# Altium footprint library Connectors THD.PcbLib: 631 footprints (part 17 of 46) (continued)
## HARTING_09 04 132 6921 [mm] "Eurocard DIN 41612, Type D, 32 Position, Rows a+c, Performance level 2, Male, Lead 3.0 mm, Pitch 5.08 mm" (continued)
  text "26" at -8.57,-61.635 h1.2
  text "32" at -8.57,-76.875 h1.2
  text "10" at -8.57,-20.995 h1.2
  text "20" at -8.57,-46.395 h1.2
  text "28" at -8.57,-66.715 h1.2
  text "30" at -8.57,-71.795 h1.2
  text "c" at -4.445,1.905 h1.2
  text "a" at 0.635,1.905 h1.2
3D body: height 9.4, standoff -3, extent -5.38,-83.83 12.64,10.17

## HARTING_09 04 232 6831 [mm] "DIN 41612, Type D, Thru-Hole; Rows a+c, 32 Position, Straight Female Backplane Connector"
height 11.6
pads (34):
  round 1.7 hole 1: a2(0,-2.54) a4(0,-7.62) a6(0,-12.7) a8(0,-17.78) a10(0,-22.86) a12(0,-27.94) a14(0,-33.02) a16(0,-38.1) a18(0,-43.18) a20(0,-48.26) a22(0,-53.34) a24(0,-58.42) a26(0,-63.5) a28(0,-68.58) a30(0,-73.66) a32(0,-78.74) c2(5.08,-2.54) c4(5.08,-7.62) c6(5.08,-12.7) c8(5.08,-17.78) c10(5.08,-22.86) c12(5.08,-27.94) c14(5.08,-33.02) c16(5.08,-38.1) c18(5.08,-43.18) c20(5.08,-48.26) c22(5.08,-53.34) c24(5.08,-58.42) c26(5.08,-63.5) c28(5.08,-68.58) c30(5.08,-73.66) c32(5.08,-78.74)
  round 3.5 / inner round 3.5 / far side round 5.1 hole 2.8: MTG1(2.24,5.63) MTG2(2.24,-84.37)
Top Overlay:
  lines w0.2: -2.71,-84.37 -0.735,-84.37 ; -2.71,-77.87 -1.71,-77.87 ; -2.71,-0.87 -1.71,-0.87 ; -2.71,5.63 -0.735,5.63 ; -1.06,-79.95 -1.06,-81.22 ; -1.06,-1.2 -1.06,2.48 ; -0.735,-86.82 -0.735,-84.37 ; -0.735,8.08 -0.735,5.63 ; 1,-86.82 -2.71,-86.82 -2.71,8.08 1,8.08 ; 3.556,-86.82 7.79,-86.82 7.79,8.08 3.556,8.08 ; 5.215,-86.82 5.215,-84.37 ; 5.215,8.08 5.215,5.63 ; 6.14,-79.75 6.14,-80.19 ; 6.14,-1.1 6.14,1.45 ; 6.79,-77.87 7.79,-77.87 ; 6.79,-0.87 7.79,-0.87 ; 7.79,-84.37 5.215,-84.37 ; 7.79,5.63 5.215,5.63 ; -1.71,-81.87 3.69,-81.87 ; -1.71,-81.87 -1.71,3.13 ; -1.71,-81.87 -1.06,-81.22 ; -1.71,3.13 3.69,3.13 ; -1.71,3.13 -1.06,2.48 ; -1.06,-81.22 3.04,-81.22 ; -1.06,2.48 3.04,2.48 ; -0.735,-84.37 0.708,-81.87 3.772,-81.87 5.215,-84.37 ; -0.735,5.63 0.708,3.13 3.772,3.13 5.215,5.63 ; 3.04,-81.22 3.04,-80.19 ; 3.04,-81.22 3.69,-81.87 ; 3.04,-80.19 6.14,-80.19 ; 3.04,-80.19 3.69,-80.84 ; 3.04,1.45 3.04,2.48 ; 3.04,1.45 3.69,2.1 ; 3.04,1.45 6.14,1.45 ; 3.04,2.48 3.69,3.13 ; 3.69,-81.87 3.69,-80.84 ; 3.69,-80.84 6.79,-80.84 ; 3.69,2.1 3.69,3.13 ; 3.69,2.1 6.79,2.1 ; 6.14,-80.19 6.79,-80.84 ; 6.14,1.45 6.79,2.1 ; 6.79,-80.84 6.79,2.1
  text "a" at -1.951,3.96 h1.2
  text "c" at 5.305,2.935 h1.2
  text "10" at -5.475,-23.46 h1.2
  text "32" at -5.675,-79.365 h1.2
  text "5" at -4.55,-10.835 h1.2
  text "30" at -5.675,-74.285 h1.2
  text "25" at -5.675,-61.585 h1.2
  text "20" at -5.675,-48.885 h1.2
  text "15" at -5.475,-36.135 h1.2
  text "1" at -4.075,-0.675 h1.2
Mechanical 8:
  lines w0.1: -1,-78.74 0,-78.74 ; -1,-73.66 0,-73.66 ; -1,-68.58 0,-68.58 ; -1,-63.5 0,-63.5 ; -1,-58.42 0,-58.42 ; -1,-53.34 0,-53.34 ; -1,-48.26 0,-48.26 ; -1,-43.18 0,-43.18 ; -1,-38.1 0,-38.1 ; -1,-33.02 0,-33.02 ; -1,-27.94 0,-27.94 ; -1,-22.86 0,-22.86 ; -1,-17.78 0,-17.78 ; -1,-12.7 0,-12.7 ; -1,-7.62 0,-7.62 ; -1,-2.54 0,-2.54 ; 0,-79.74 0,-78.74 ; 0,-77.74 0,-78.74 ; 0,-74.66 0,-73.66 ; 0,-72.66 0,-73.66 ; 0,-69.58 0,-68.58 ; 0,-67.58 0,-68.58 ; 0,-64.5 0,-63.5 ; 0,-62.5 0,-63.5 ; 0,-59.42 0,-58.42 ; 0,-57.42 0,-58.42 ; 0,-54.34 0,-53.34 ; 0,-52.34 0,-53.34 ; 0,-49.26 0,-48.26 ; 0,-47.26 0,-48.26 ; 0,-44.18 0,-43.18 ; 0,-42.18 0,-43.18 ; 0,-39.1 0,-38.1 ; 0,-37.1 0,-38.1 ; 0,-34.02 0,-33.02 ; 0,-32.02 0,-33.02 ; 0,-28.94 0,-27.94 ; 0,-26.94 0,-27.94 ; 0,-23.86 0,-22.86 ; 0,-21.86 0,-22.86 ; 0,-18.78 0,-17.78 ; 0,-16.78 0,-17.78 ; 0,-13.7 0,-12.7 ; 0,-11.7 0,-12.7 ; 0,-8.62 0,-7.62 ; 0,-6.62 0,-7.62 ; 0,-3.54 0,-2.54 ; 0,-1.54 0,-2.54 ; 1,-78.74 0,-78.74 ; 1,-73.66 0,-73.66 ; 1,-68.58 0,-68.58 ; 1,-63.5 0,-63.5 ; 1,-58.42 0,-58.42 ; 1,-53.34 0,-53.34 ; 1,-48.26 0,-48.26 ; 1,-43.18 0,-43.18 ; 1,-38.1 0,-38.1 ; 1,-33.02 0,-33.02 ; 1,-27.94 0,-27.94 ; 1,-22.86 0,-22.86 ; 1,-17.78 0,-17.78 ; 1,-12.7 0,-12.7 ; 1,-7.62 0,-7.62 ; 1,-2.54 0,-2.54 ; 1.24,-84.37 2.24,-84.37 ; 1.24,5.63 2.24,5.63 ; 1.54,-39.37 2.54,-39.37 ; 2.24,-85.37 2.24,-84.37 ; 2.24,-83.37 2.24,-84.37 ; 2.24,4.63 2.24,5.63 ; 2.24,6.63 2.24,5.63 ; 2.54,-40.37 2.54,-39.37 ; 2.54,-38.37 2.54,-39.37 ; 3.24,-84.37 2.24,-84.37 ; 3.24,5.63 2.24,5.63 ; 3.54,-39.37 2.54,-39.37 ; 4.08,-78.74 5.08,-78.74 ; 4.08,-73.66 5.08,-73.66 ; 4.08,-68.58 5.08,-68.58 ; 4.08,-63.5 5.08,-63.5 ; 4.08,-58.42 5.08,-58.42 ; 4.08,-53.34 5.08,-53.34 ; 4.08,-48.26 5.08,-48.26 ; 4.08,-43.18 5.08,-43.18 ; 4.08,-38.1 5.08,-38.1 ; 4.08,-33.02 5.08,-33.02 ; 4.08,-27.94 5.08,-27.94 ; 4.08,-22.86 5.08,-22.86 ; 4.08,-17.78 5.08,-17.78 ; 4.08,-12.7 5.08,-12.7 ; 4.08,-7.62 5.08,-7.62 ; 4.08,-2.54 5.08,-2.54 ; 5.08,-79.74 5.08,-78.74 ; 5.08,-77.74 5.08,-78.74 ; 5.08,-74.66 5.08,-73.66 ; 5.08,-72.66 5.08,-73.66 ; 5.08,-69.58 5.08,-68.58 ; 5.08,-67.58 5.08,-68.58 ; 5.08,-64.5 5.08,-63.5 ; 5.08,-62.5 5.08,-63.5 ; 5.08,-59.42 5.08,-58.42 ; 5.08,-57.42 5.08,-58.42 ; 5.08,-54.34 5.08,-53.34 ; 5.08,-52.34 5.08,-53.34 ; 5.08,-49.26 5.08,-48.26 ; 5.08,-47.26 5.08,-48.26 ; 5.08,-44.18 5.08,-43.18 ; 5.08,-42.18 5.08,-43.18 ; 5.08,-39.1 5.08,-38.1 ; 5.08,-37.1 5.08,-38.1 ; 5.08,-34.02 5.08,-33.02 ; 5.08,-32.02 5.08,-33.02 ; 5.08,-28.94 5.08,-27.94 ; 5.08,-26.94 5.08,-27.94 ; 5.08,-23.86 5.08,-22.86 ; 5.08,-21.86 5.08,-22.86 ; 5.08,-18.78 5.08,-17.78 ; 5.08,-16.78 5.08,-17.78 ; 5.08,-13.7 5.08,-12.7 ; 5.08,-11.7 5.08,-12.7 ; 5.08,-8.62 5.08,-7.62 ; 5.08,-6.62 5.08,-7.62 ; 5.08,-3.54 5.08,-2.54 ; 5.08,-1.54 5.08,-2.54 ; 6.08,-78.74 5.08,-78.74 ; 6.08,-73.66 5.08,-73.66 ; 6.08,-68.58 5.08,-68.58 ; 6.08,-63.5 5.08,-63.5 ; 6.08,-58.42 5.08,-58.42 ; 6.08,-53.34 5.08,-53.34 ; 6.08,-48.26 5.08,-48.26 ; 6.08,-43.18 5.08,-43.18 ; 6.08,-38.1 5.08,-38.1 ; 6.08,-33.02 5.08,-33.02 ; 6.08,-27.94 5.08,-27.94 ; 6.08,-22.86 5.08,-22.86 ; 6.08,-17.78 5.08,-17.78 ; 6.08,-12.7 5.08,-12.7 ; 6.08,-7.62 5.08,-7.62 ; 6.08,-2.54 5.08,-2.54
Mechanical 14:
  circle w0.1: c2.24,5.63 r1.425
  circle w0.1: c2.24,-84.37 r1.425
  lines w0.1: -2.71,-84.37 -0.735,-84.37 ; -2.71,-77.87 -1.71,-77.87 ; -2.71,-0.87 -1.71,-0.87 ; -0.735,-86.82 -0.735,-84.37 ; -0.735,8.08 -0.735,5.63 0.708,3.13 3.772,3.13 5.215,5.63 ; -0.3,2.925 1.675,2.925 ; 5.215,-86.82 5.215,-84.37 ; 5.215,8.08 5.215,5.63 ; 6.79,-77.87 7.79,-77.87 ; 6.79,-0.87 7.79,-0.87 ; 7.79,-84.37 5.215,-84.37 ; 7.79,5.63 5.215,5.63 ; -1.71,-81.87 3.69,-81.87 ; -1.71,-81.87 -1.71,3.13 ; -1.71,-81.87 -1.06,-81.22 ; -1.71,3.13 3.69,3.13 ; -1.71,3.13 -1.06,2.48 ; -1.06,-81.22 3.04,-81.22 ; -1.06,-81.22 -1.06,2.48 ; -1.06,2.48 3.04,2.48 ; -0.735,-84.37 0.708,-81.87 3.772,-81.87 5.215,-84.37 ; 3.04,-81.22 3.04,-80.19 ; 3.04,-81.22 3.69,-81.87 ; 3.04,-80.19 6.14,-80.19 ; 3.04,-80.19 3.69,-80.84 ; 3.04,1.45 3.04,2.48 ; 3.04,1.45 3.69,2.1 ; 3.04,1.45 6.14,1.45 ; 3.04,2.48 3.69,3.13 ; 3.69,-81.87 3.69,-80.84 ; 3.69,-80.84 6.79,-80.84 ; 3.69,2.1 3.69,3.13 ; 3.69,2.1 6.79,2.1 ; 6.14,-80.19 6.14,1.45 ; 6.14,-80.19 6.79,-80.84 ; 6.14,1.45 6.79,2.1 ; 6.79,-80.84 6.79,2.1 ; -2.71,-86.82 7.79,-86.82 7.79,8.08 -2.71,8.08 -2.71,-86.82
  text "a" at -1.951,3.96 h1.2
  text "c" at 5.305,2.935 h1.2
  text "10" at -5.475,-23.46 h1.2
  text "32" at -5.675,-79.365 h1.2
  text "5" at -4.55,-10.835 h1.2
  text "30" at -5.675,-74.285 h1.2
  text "25" at -5.675,-61.585 h1.2
  text "20" at -5.675,-48.885 h1.2
  text "15" at -5.475,-36.135 h1.2
  text "1" at -4.075,-0.675 h1.2
3D body: height 11.6, standoff -4.5, extent -2.71,-86.82 7.79,8.08

## HARTING_09 06 115 2911 [mm] "DIN 41612, Type H, 15 Poles, Rows z+d, Performance level 1, Right Angle Male Connector, Lead 3.0 mm, Pitch 5.08mm"
height 11
pads (17):
  round 2.3 hole 1.6: d6(-5.08,-5.08) d10(-5.08,-15.24) d14(-5.08,-25.4) d18(-5.08,-35.56) d22(-5.08,-45.72) d26(-5.08,-55.88) d30(-5.08,-66.04) z4(0,0) z8(0,-10.16) z12(0,-20.32) z16(0,-30.48) z20(0,-40.64) z24(0,-50.8) z28(0,-60.96) z32(0,-71.12)
  round 3.5 / inner round 3.5 / far side round 5.1 hole 2.8: MTG1(5.08,12.7) MTG2(5.08,-76.2)
Top Overlay:
  lines w0.2: -6.02,-71.55 -1.696,-71.55 ; -6.02,-67.516 -6.02,-74.3 2.18,-74.3 2.18,-78.725 4.14,-78.725 ; -6.02,-64.564 -6.02,-57.356 ; -6.02,-54.404 -6.02,-47.196 ; -6.02,-44.244 -6.02,-37.036 ; -6.02,-34.084 -6.02,-26.876 ; -6.02,-23.924 -6.02,-16.716 ; -6.02,-13.764 -6.02,-6.556 ; -6.02,-3.604 -6.02,10.8 2.18,10.8 2.18,15.225 4.14,15.225 ; -6.02,4.67 8.38,4.67 8.38,11.95 18.73,11.95 18.73,9.05 17.21,9.05 17.21,-72.55 18.73,-72.55 18.73,-75.45 8.38,-75.45 8.38,-71.55 1.696,-71.55 ; 5.765,-78.725 10.23,-78.725 10.23,-75.45 ; 5.765,15.225 10.23,15.225 10.23,11.95
  text "z4" at -8.8,-0.75 h1.2
  text "d6" at -8.8,-5.83 h1.2
  text "d10" at -10.07,-15.99 h1.2
  text "z8" at -8.8,-10.91 h1.2
  text "d14" at -10.07,-26.15 h1.2
  text "z12" at -10.07,-21.07 h1.2
  text "d18" at -10.07,-36.31 h1.2
  text "z16" at -10.07,-31.23 h1.2
  text "d22" at -10.07,-46.47 h1.2
  text "z20" at -10.07,-41.39 h1.2
  text "d26" at -10.07,-56.63 h1.2
  text "z24" at -10.07,-51.55 h1.2
  text "d30" at -10.07,-66.79 h1.2
  text "z28" at -10.07,-61.71 h1.2
  text "z32" at -10.07,-71.87 h1.2
Mechanical 8:
  lines w0.2: 4.064,-31.75 5.08,-31.75 5.08,-32.75 ; 7.84,-78.725 7.84,15.225
  text "PCB" at 6.985,-33.655 h1.2
Mechanical 14:
  lines w0.1: -6.02,-71.55 -1.696,-71.55 ; -6.02,-67.516 -6.02,-74.3 2.18,-74.3 2.18,-78.725 10.23,-78.725 10.23,-75.45 ; -6.02,-64.564 -6.02,-57.356 ; -6.02,-54.404 -6.02,-47.196 ; -6.02,-44.244 -6.02,-37.036 ; -6.02,-34.084 -6.02,-26.876 ; -6.02,-23.924 -6.02,-16.716 ; -6.02,-13.764 -6.02,-6.556 ; -6.02,-3.604 -6.02,10.8 2.18,10.8 2.18,15.225 10.23,15.225 10.23,11.95 ; -6.02,4.67 8.38,4.67 8.38,11.95 18.73,11.95 18.73,9.05 17.21,9.05 17.21,-72.55 18.73,-72.55 18.73,-75.45 8.38,-75.45 8.38,-71.55 1.696,-71.55
  text "z4" at -8.8,-0.75 h1.2
  text "d6" at -8.8,-5.83 h1.2
  text "d10" at -10.07,-15.99 h1.2
  text "z8" at -8.8,-10.91 h1.2
  text "d14" at -10.07,-26.15 h1.2
  text "z12" at -10.07,-21.07 h1.2
  text "d18" at -10.07,-36.31 h1.2
  text "z16" at -10.07,-31.23 h1.2
  text "d22" at -10.07,-46.47 h1.2
  text "z20" at -10.07,-41.39 h1.2
  text "d26" at -10.07,-56.63 h1.2
  text "z24" at -10.07,-51.55 h1.2
  text "d30" at -10.07,-66.79 h1.2
  text "z28" at -10.07,-61.71 h1.2
  text "z32" at -10.07,-71.87 h1.2
3D body: height 11.2, standoff -3.5, extent -6.02,-78.725 18.73,15.225

## HARTING_09 06 131 6924 [mm] "DIN 41612, Type MH, 24+ 7 Contacts, Rows z+b+d, Performance level 2, Right Angled Male Connector"
height 11.22
pads (33):
  round 1.7 hole 1: b2(2.54,0) b4(2.54,-5.08) b6(2.54,-10.16) b8(2.54,-15.24) b10(2.54,-20.32) b12(2.54,-25.4) b14(2.54,-30.48) b16(2.54,-35.56) d2(0,0) d4(0,-5.08) d6(0,-10.16) d8(0,-15.24) d10(0,-20.32) d12(0,-25.4) d14(0,-30.48) d16(0,-35.56) z2(5.08,0) z4(5.08,-5.08) z6(5.08,-10.16) z8(5.08,-15.24) z10(5.08,-20.32) z12(5.08,-25.4) z14(5.08,-30.48) z16(5.08,-35.56)
  round 2.3 hole 1.6: d22(-2.54,-50.8) d26(-2.54,-60.96) d30(-2.54,-71.12) z20(2.54,-45.72) z24(2.54,-55.88) z28(2.54,-66.04) z32(2.54,-76.2)
  round 3.5 / inner round 3.5 / far side round 5.1 hole 2.8: MTG1(7.62,7.62) MTG2(7.62,-81.28)
Top Overlay:
  lines w0.2: -3.43,-76.63 1.051,-76.63 ; -2.63,-72.667 -2.63,-75.83 -3.43,-75.83 -3.43,-79.36 4.67,-79.36 4.67,-83.805 6.325,-83.805 ; -2.63,-69.573 -2.63,-62.507 ; -2.63,-59.413 -2.63,-52.347 ; -2.63,-49.253 -2.63,-41.345 -0.83,-41.345 -0.83,-38.1 -0.68,-38.1 -0.68,-36.668 ; -0.68,-34.452 -0.68,-31.588 ; -0.68,-29.372 -0.68,-26.508 ; -0.68,-24.292 -0.68,-21.428 ; -0.68,-19.212 -0.68,-16.348 ; -0.68,-14.132 -0.68,-11.268 ; -0.68,-9.052 -0.68,-6.188 ; -0.68,-3.972 -0.68,-1.108 ; -0.68,1.108 -0.68,4.79 10.77,4.79 ; -0.68,3.62 10.77,3.62 10.77,6.87 21.32,6.87 21.32,3.97 19.82,3.97 19.82,-77.63 21.32,-77.63 21.32,-80.53 10.77,-80.53 ; 4.029,-76.63 10.77,-76.63 ; 4.67,4.79 4.67,10.145 6.325,10.145 ; 9.025,-83.805 12.77,-83.805 12.77,-80.53 ; 9.025,10.145 12.77,10.145 12.77,6.87 ; 10.77,-80.53 10.77,-76.63 ; 10.77,-80.53 10.77,-76.63
  text "16" at -3.74,-36.165 h1.2
  text "14" at -3.74,-31.085 h1.2
  text "12" at -3.74,-26.005 h1.2
  text "10" at -3.74,-20.925 h1.2
  text "8" at -2.79,-15.845 h1.2
  text "6" at -2.79,-10.765 h1.2
  text "d" at -0.318,1.905 h1.2
  text "z" at 4.608,1.905 h1.2
  text "4" at -2.79,-5.685 h1.2
  text "2" at -2.765,-0.543 h1.2
  text "b" at 2.223,1.905 h1.2
  text "z32" at -7.53,-76.95 h1.2
  text "z28" at -7.53,-66.79 h1.2
  text "d30" at -7.53,-71.87 h1.2
  text "z24" at -7.53,-56.63 h1.2
  text "d26" at -7.53,-61.71 h1.2
  text "z20" at -7.53,-46.47 h1.2
  text "d22" at -7.53,-51.55 h1.2
Mechanical 8:
  lines w0.1: -3.04,-71.12 -2.54,-71.12 ; -3.04,-60.96 -2.54,-60.96 ; -3.04,-50.8 -2.54,-50.8 ; -2.54,-71.62 -2.54,-71.12 ; -2.54,-70.62 -2.54,-71.12 ; -2.54,-61.46 -2.54,-60.96 ; -2.54,-60.46 -2.54,-60.96 ; -2.54,-51.3 -2.54,-50.8 ; -2.54,-50.3 -2.54,-50.8 ; -2.04,-71.12 -2.54,-71.12 ; -2.04,-60.96 -2.54,-60.96 ; -2.04,-50.8 -2.54,-50.8 ; -0.5,-35.56 0,-35.56 ; -0.5,-30.48 0,-30.48 ; -0.5,-25.4 0,-25.4 ; -0.5,-20.32 0,-20.32 ; -0.5,-15.24 0,-15.24 ; -0.5,-10.16 0,-10.16 ; -0.5,-5.08 0,-5.08 ; 0,-36.06 0,-35.56 ; 0,-35.06 0,-35.56 ; 0,-30.98 0,-30.48 ; 0,-29.98 0,-30.48 ; 0,-25.9 0,-25.4 ; 0,-24.9 0,-25.4 ; 0,-20.82 0,-20.32 ; 0,-19.82 0,-20.32 ; 0,-15.74 0,-15.24 ; 0,-14.74 0,-15.24 ; 0,-10.66 0,-10.16 ; 0,-9.66 0,-10.16 ; 0,-5.58 0,-5.08 ; 0,-4.58 0,-5.08 ; 0.5,-35.56 0,-35.56 ; 0.5,-30.48 0,-30.48 ; 0.5,-25.4 0,-25.4 ; 0.5,-20.32 0,-20.32 ; 0.5,-15.24 0,-15.24 ; 0.5,-10.16 0,-10.16 ; 0.5,-5.08 0,-5.08 ; 2.04,-76.2 2.54,-76.2 ; 2.04,-66.04 2.54,-66.04 ; 2.04,-55.88 2.54,-55.88 ; 2.04,-45.72 2.54,-45.72 ; 2.04,-35.56 2.54,-35.56 ; 2.04,-30.48 2.54,-30.48 ; 2.04,-25.4 2.54,-25.4 ; 2.04,-20.32 2.54,-20.32 ; 2.04,-15.24 2.54,-15.24 ; 2.04,-10.16 2.54,-10.16 ; 2.04,-5.08 2.54,-5.08 ; 2.04,0 2.54,0 ; 2.54,-76.7 2.54,-76.2 ; 2.54,-75.7 2.54,-76.2 ; 2.54,-66.54 2.54,-66.04 ; 2.54,-65.54 2.54,-66.04 ; 2.54,-56.38 2.54,-55.88 ; 2.54,-55.38 2.54,-55.88 ; 2.54,-46.22 2.54,-45.72 ; 2.54,-45.22 2.54,-45.72 ; 2.54,-36.06 2.54,-35.56 ; 2.54,-35.06 2.54,-35.56 ; 2.54,-30.98 2.54,-30.48 ; 2.54,-29.98 2.54,-30.48 ; 2.54,-25.9 2.54,-25.4 ; 2.54,-24.9 2.54,-25.4 ; 2.54,-20.82 2.54,-20.32 ; 2.54,-19.82 2.54,-20.32 ; 2.54,-15.74 2.54,-15.24 ; 2.54,-14.74 2.54,-15.24 ; 2.54,-10.66 2.54,-10.16 ; 2.54,-9.66 2.54,-10.16 ; 2.54,-5.58 2.54,-5.08 ; 2.54,-4.58 2.54,-5.08 ; 2.54,-0.5 2.54,0 ; 2.54,0.5 2.54,0 ; 3.04,-76.2 2.54,-76.2 ; 3.04,-66.04 2.54,-66.04 ; 3.04,-55.88 2.54,-55.88 ; 3.04,-45.72 2.54,-45.72 ; 3.04,-35.56 2.54,-35.56 ; 3.04,-30.48 2.54,-30.48 ; 3.04,-25.4 2.54,-25.4 ; 3.04,-20.32 2.54,-20.32 ; 3.04,-15.24 2.54,-15.24 ; 3.04,-10.16 2.54,-10.16 ; 3.04,-5.08 2.54,-5.08 ; 3.04,0 2.54,0 ; 4.58,-35.56 5.08,-35.56 ; 4.58,-30.48 5.08,-30.48 ; 4.58,-25.4 5.08,-25.4 ; 4.58,-20.32 5.08,-20.32 ; 4.58,-15.24 5.08,-15.24 ; 4.58,-10.16 5.08,-10.16 ; 4.58,-5.08 5.08,-5.08 ; 4.58,0 5.08,0 ; 5.08,-36.06 5.08,-35.56 ; 5.08,-35.06 5.08,-35.56 ; 5.08,-30.98 5.08,-30.48 ; 5.08,-29.98 5.08,-30.48 ; 5.08,-25.9 5.08,-25.4 ; 5.08,-24.9 5.08,-25.4 ; 5.08,-20.82 5.08,-20.32 ; 5.08,-19.82 5.08,-20.32 ; 5.08,-15.74 5.08,-15.24 ; 5.08,-14.74 5.08,-15.24 ; 5.08,-10.66 5.08,-10.16 ; 5.08,-9.66 5.08,-10.16 ; 5.08,-5.58 5.08,-5.08 ; 5.08,-4.58 5.08,-5.08 ; 5.08,-0.5 5.08,0 ; 5.08,0.5 5.08,0 ; 5.58,-35.56 5.08,-35.56 ; 5.58,-30.48 5.08,-30.48 ; 5.58,-25.4 5.08,-25.4 ; 5.58,-20.32 5.08,-20.32 ; 5.58,-15.24 5.08,-15.24 ; 5.58,-10.16 5.08,-10.16 ; 5.58,-5.08 5.08,-5.08 ; 5.58,0 5.08,0 ; 7.12,-81.28 7.62,-81.28 ; 7.12,7.62 7.62,7.62 ; 7.62,-81.78 7.62,-81.28 ; 7.62,-80.78 7.62,-81.28 ; 7.62,7.12 7.62,7.62 ; 7.62,8.12 7.62,7.62 ; 8.12,-81.28 7.62,-81.28 ; 8.12,7.62 7.62,7.62 ; 10.38,-83.805 10.38,-36.83 10.38,10.145 ; 0,0 0,0.5 0,0 ; 0,0 -0.5,0 0,0 ; 0,0 0,-0.5 0,0 ; 0,0 0.5,0 0,0
  text "PCB Edge" at 9.525,-38.735 h1.2
Mechanical 14:
  circle w0.1: c7.62,-81.28 r1.29
  circle w0.1: c7.62,7.62 r1.29
  lines w0.1: -3.43,-76.63 10.77,-76.63 ; -0.68,3.62 10.77,3.62 10.77,6.87 21.32,6.87 21.32,3.97 19.82,3.97 19.82,-77.63 21.32,-77.63 21.32,-80.53 10.77,-80.53 ; 4.67,4.79 4.67,10.145 12.77,10.145 12.77,6.87 ; 10.77,4.79 -0.68,4.79 -0.68,-38.1 -0.83,-38.1 -0.83,-41.345 -2.63,-41.345 -2.63,-75.83 -3.43,-75.83 -3.43,-79.36 4.67,-79.36 4.67,-83.805 12.77,-83.805 12.77,-80.53 ; 10.77,-80.53 10.77,-76.63 ; 10.77,-80.53 10.77,-76.63
  text "16" at -3.74,-36.165 h1.2
  text "14" at -3.74,-31.085 h1.2
  text "12" at -3.74,-26.005 h1.2
  text "10" at -3.74,-20.925 h1.2
  text "8" at -2.79,-15.845 h1.2
  text "6" at -2.79,-10.765 h1.2
  text "d" at -0.318,1.905 h1.2
  text "z" at 4.608,1.905 h1.2
  text "4" at -2.79,-5.685 h1.2
  text "2" at -2.765,-0.543 h1.2
  text "b" at 2.223,1.905 h1.2
  text "z32" at -7.53,-76.95 h1.2
  text "z28" at -7.53,-66.79 h1.2
  text "d30" at -7.53,-71.87 h1.2
  text "z24" at -7.53,-56.63 h1.2
  text "d26" at -7.53,-61.71 h1.2
  text "z20" at -7.53,-46.47 h1.2
  text "d22" at -7.53,-51.55 h1.2
3D body: height 11.22, standoff -3.48, extent -3.43,-83.805 21.32,10.145

## HARTING_09 06 148 6901 [mm] "DIN 41612, Type F, 48 Contacts, Rows z+b+d, Performance level 2, Right Angle Male Connector"
height 10.1
pads (50):
  round 1.7 hole 1: b2(2.54,-2.54) b4(2.54,-7.62) b6(2.54,-12.7) b8(2.54,-17.78) b10(2.54,-22.86) b12(2.54,-27.94) b14(2.54,-33.02) b16(2.54,-38.1) b18(2.54,-43.18) b20(2.54,-48.26) b22(2.54,-53.34) b24(2.54,-58.42) b26(2.54,-63.5) b28(2.54,-68.58) b30(2.54,-73.66) b32(2.54,-78.74) d2(0,-2.54) d4(0,-7.62) d6(0,-12.7) d8(0,-17.78) d10(0,-22.86) d12(0,-27.94) d14(0,-33.02) d16(0,-38.1) d18(0,-43.18) d20(0,-48.26) d22(0,-53.34) d24(0,-58.42) d26(0,-63.5) d28(0,-68.58) d30(0,-73.66) d32(0,-78.74) z2(5.08,-2.54) z4(5.08,-7.62) z6(5.08,-12.7) z8(5.08,-17.78) z10(5.08,-22.86) z12(5.08,-27.94) z14(5.08,-33.02) z16(5.08,-38.1) z18(5.08,-43.18) z20(5.08,-48.26) z22(5.08,-53.34) z24(5.08,-58.42) z26(5.08,-63.5) z28(5.08,-68.58) z30(5.08,-73.66) z32(5.08,-78.74)
  round 3.5 / inner round 3.5 / far side round 5.1 hole 2.8: MTG1(7.62,5.08) MTG2(7.62,-83.82)
Top Overlay:
  lines w0.2: -0.78,-80.29 10.8,-80.29 ; -0.78,-79.742 -0.78,-80.97 4.67,-80.97 4.67,-86.37 6.63,-86.37 ; -0.78,-1.538 -0.78,2.95 6,2.95 ; -0.78,1.83 10.8,1.83 10.8,4.38 21.32,4.38 21.32,1.48 19.82,1.48 19.82,-80.22 21.32,-80.22 21.32,-83.12 10.8,-83.12 10.8,-79.17 6.275,-79.17 ; 4.67,2.95 4.67,7.63 6.63,7.63 ; 8.255,-86.37 12.72,-86.37 ; 8.255,7.63 12.72,7.63 ; 9.2,2.95 10.8,2.95 ; 12.77,-86.37 12.77,-83.12 ; 12.77,4.38 12.77,7.63
  text "5" at -2.207,-10.795 h1.2
  text "30" at -3.477,-74.295 h1.2
  text "25" at -3.477,-61.595 h1.2
  text "20" at -3.477,-48.895 h1.2
  text "15" at -3.16,-36.195 h1.2
  text "10" at -3.16,-23.495 h1.2
  text "32" at -3.477,-79.375 h1.2
  text "b" at 2.222,-0.635 h1.2
  text "z" at 4.763,-0.635 h1.2
  text "1" at -1.89,-0.635 h1.2
  text "d" at -0.318,-0.635 h1.2
Mechanical 8:
  lines w0.1: -2,0 0,0 0,-2 ; -0.78,-77.738 -0.78,-74.662 ; -0.78,-72.658 -0.78,-69.582 ; -0.78,-67.578 -0.78,-64.502 ; -0.78,-62.498 -0.78,-59.422 ; -0.78,-57.418 -0.78,-54.355 ; -0.78,-52.326 -0.78,-49.262 ; -0.78,-47.258 -0.78,-44.182 ; -0.78,-42.178 -0.78,-39.102 ; -0.78,-37.098 -0.78,-34.022 ; -0.78,-32.018 -0.78,-28.942 ; -0.78,-26.938 -0.78,-23.862 ; -0.78,-21.858 -0.78,-18.782 ; -0.78,-16.778 -0.78,-13.702 ; -0.78,-11.698 -0.78,-8.622 ; -0.78,-6.618 -0.78,-3.542 ; 0.54,-39.37 2.54,-39.37 2.54,-41.37 ; 10.38,-78.74 10.38,0
Mechanical 14:
  lines w0.1: -0.78,-80.29 10.8,-80.29 ; -0.78,-79.17 10.8,-79.17 10.8,-83.12 21.32,-83.12 21.32,-80.22 19.82,-80.22 19.82,1.48 21.32,1.48 21.32,4.38 10.8,4.38 10.8,1.83 -0.78,1.83 ; 4.67,2.95 4.67,7.63 12.77,7.63 12.77,4.38 ; 10.8,2.95 -0.78,2.95 -0.78,-80.97 4.67,-80.97 4.67,-86.37 12.77,-86.37 12.77,-83.12
  text "1" at -1.89,-0.635 h1.2
  text "32" at -3.477,-79.375 h1.2
  text "10" at -3.16,-23.495 h1.2
  text "15" at -3.16,-36.195 h1.2
  text "20" at -3.477,-48.895 h1.2
  text "25" at -3.477,-61.595 h1.2
  text "30" at -3.477,-74.295 h1.2
  text "5" at -2.207,-10.795 h1.2
3D body: height 11.25, standoff -3.55, extent -0.78,-86.37 21.32,7.63

## HARTING_09 06 203 2811 [mm] "DIN 41612, Type H, 3 Poles, Single Row, Straight Female Connector, Lead 4 mm, Pitch 5.08mm"
height 11.6
pads (5):
  round 2.3 hole 1.6: 1(-2.54,5.08) 2(0,0) 3(-2.54,-5.08)
  round 3.5 / inner round 3.5 / far side round 5.1 hole 2.8: MTG1(-0.3,13.25) MTG2(-0.3,-13.25)
Top Overlay:
  lines w0.2: -3.675,-6.136 -3.675,-10.175 ; -3.675,-4.024 -3.675,4.024 ; -3.675,6.136 -3.675,10.175 ; -3.475,-6.316 -3.475,-6.855 ; -3.475,-3.844 -3.475,-3.305 ; -3.475,3.844 -3.475,3.305 ; -3.475,6.316 -3.475,6.855 ; -3.275,-15.7 -3.275,-13.25 -2.034,-10.725 ; -3.275,15.7 -3.275,13.25 -2.034,10.725 ; -3.196,-6.484 -3.475,-6.855 ; -3.196,-3.676 -3.475,-3.305 ; -3.196,3.676 -3.475,3.305 ; -3.196,6.484 -3.475,6.855 ; -1.443,-0.565 -2.565,-0.565 ; -1.443,0.565 -2.565,0.565 ; -1.097,-5.645 2.565,-5.645 ; -1.097,-4.515 2.565,-4.515 ; -1.097,4.515 2.565,4.515 ; -1.097,5.645 2.565,5.645 ; 1.434,-10.725 2.675,-13.25 2.675,-15.7 ; 1.434,10.725 2.675,13.25 2.675,15.7 ; 1.443,-0.565 2.565,-0.565 ; 1.443,0.565 2.565,0.565 ; -4.225,-10.725 -4.225,10.725 ; -4.225,-10.725 1.675,-10.725 ; -4.225,-10.725 -3.675,-10.175 ; -4.225,10.725 1.675,10.725 ; -4.225,10.725 -3.675,10.175 ; -3.675,-10.175 1.125,-10.175 ; -3.675,10.175 1.125,10.175 ; -3.475,-6.855 3.475,-6.855 ; -3.475,-3.305 3.475,-3.305 ; -3.475,-1.775 3.475,-1.775 ; -3.475,-1.775 -3.475,1.775 ; -3.475,-1.775 -2.565,-0.565 ; -3.475,1.775 3.475,1.775 ; -3.475,1.775 -2.565,0.565 ; -3.475,3.305 3.475,3.305 ; -3.475,6.855 3.475,6.855 ; -2.565,-0.565 -2.565,0.565 ; 1.125,-10.175 1.675,-10.725 ; 1.125,-10.175 1.125,-9.125 ; 1.125,-9.125 1.675,-9.675 ; 1.125,-9.125 3.675,-9.125 ; 1.125,9.125 1.125,10.175 ; 1.125,9.125 1.675,9.675 ; 1.125,9.125 3.675,9.125 ; 1.125,10.175 1.675,10.725 ; 1.675,-10.725 1.675,-9.675 ; 1.675,-9.675 4.225,-9.675 ; 1.675,9.675 1.675,10.725 ; 1.675,9.675 4.225,9.675 ; 2.565,-5.645 3.475,-6.855 ; 2.565,-5.645 2.565,-4.515 ; 2.565,-4.515 3.475,-3.305 ; 2.565,-0.565 3.475,-1.775 ; 2.565,-0.565 2.565,0.565 ; 2.565,0.565 3.475,1.775 ; 2.565,4.515 3.475,3.305 ; 2.565,4.515 2.565,5.645 ; 2.565,5.645 3.475,6.855 ; 3.475,-6.855 3.475,-3.305 ; 3.475,-1.775 3.475,1.775 ; 3.475,3.305 3.475,6.855 ; 3.675,-9.125 3.675,9.125 ; 3.675,-9.125 4.225,-9.675 ; 3.675,9.125 4.225,9.675 ; 4.225,-9.675 4.225,9.675 ; -5.25,-15.7 -5.25,15.7 5.25,15.7 5.25,-15.7 -5.25,-15.7
  text "1" at -6.44,4.555 h1.2
Mechanical 8:
  lines w0.1: -3.04,-5.08 -2.54,-5.08 ; -3.04,5.08 -2.54,5.08 ; -2.54,-5.58 -2.54,-5.08 ; -2.54,-4.58 -2.54,-5.08 ; -2.54,4.58 -2.54,5.08 ; -2.54,5.58 -2.54,5.08 ; -2.04,-5.08 -2.54,-5.08 ; -2.04,5.08 -2.54,5.08 ; -0.8,-13.25 -0.3,-13.25 ; -0.8,13.25 -0.3,13.25 ; -0.5,0 0,0 ; -0.3,-13.75 -0.3,-13.25 ; -0.3,-12.75 -0.3,-13.25 ; -0.3,12.75 -0.3,13.25 ; -0.3,13.75 -0.3,13.25 ; 0,-0.5 0,0 ; 0,0.5 0,0 ; 0.2,-13.25 -0.3,-13.25 ; 0.2,13.25 -0.3,13.25 ; 0.5,0 0,0
Mechanical 14:
  lines w0.1: -3.275,-15.7 -3.275,-13.25 -2.034,-10.725 ; -3.275,15.7 -3.275,13.25 -2.034,10.725 ; 1.434,-10.725 2.675,-13.25 2.675,-15.7 ; 1.434,10.725 2.675,13.25 2.675,15.7 ; -4.225,-10.725 -4.225,10.725 ; -4.225,-10.725 1.675,-10.725 ; -4.225,-10.725 -3.675,-10.175 ; -4.225,10.725 1.675,10.725 ; -4.225,10.725 -3.675,10.175 ; -3.675,-10.175 1.125,-10.175 ; -3.675,-10.175 -3.675,10.175 ; -3.675,10.175 1.125,10.175 ; -3.475,-6.855 3.475,-6.855 ; -3.475,-6.855 -3.475,-3.305 ; -3.475,-6.855 -2.565,-5.645 ; -3.475,-3.305 3.475,-3.305 ; -3.475,-3.305 -2.565,-4.515 ; -3.475,-1.775 3.475,-1.775 ; -3.475,-1.775 -3.475,1.775 ; -3.475,-1.775 -2.565,-0.565 ; -3.475,1.775 3.475,1.775 ; -3.475,1.775 -2.565,0.565 ; -3.475,3.305 3.475,3.305 ; -3.475,3.305 -3.475,6.855 ; -3.475,3.305 -2.565,4.515 ; -3.475,6.855 3.475,6.855 ; -3.475,6.855 -2.565,5.645 ; -2.565,-5.645 2.565,-5.645 ; -2.565,-5.645 -2.565,-4.515 ; -2.565,-4.515 2.565,-4.515 ; -2.565,-0.565 2.565,-0.565 ; -2.565,-0.565 -2.565,0.565 ; -2.565,0.565 2.565,0.565 ; -2.565,4.515 2.565,4.515 ; -2.565,4.515 -2.565,5.645 ; -2.565,5.645 2.565,5.645 ; 1.125,-10.175 1.675,-10.725 ; 1.125,-10.175 1.125,-9.125 ; 1.125,-9.125 1.675,-9.675 ; 1.125,-9.125 3.675,-9.125 ; 1.125,9.125 1.125,10.175 ; 1.125,9.125 1.675,9.675 ; 1.125,9.125 3.675,9.125 ; 1.125,10.175 1.675,10.725 ; 1.675,-10.725 1.675,-9.675 ; 1.675,-9.675 4.225,-9.675 ; 1.675,9.675 1.675,10.725 ; 1.675,9.675 4.225,9.675 ; 2.565,-5.645 3.475,-6.855 ; 2.565,-5.645 2.565,-4.515 ; 2.565,-4.515 3.475,-3.305 ; 2.565,-0.565 3.475,-1.775 ; 2.565,-0.565 2.565,0.565 ; 2.565,0.565 3.475,1.775 ; 2.565,4.515 3.475,3.305 ; 2.565,4.515 2.565,5.645 ; 2.565,5.645 3.475,6.855 ; 3.475,-6.855 3.475,-3.305 ; 3.475,-1.775 3.475,1.775 ; 3.475,3.305 3.475,6.855 ; 3.675,-9.125 3.675,9.125 ; 3.675,-9.125 4.225,-9.675 ; 3.675,9.125 4.225,9.675 ; 4.225,-9.675 4.225,9.675 ; -5.25,-15.7 -5.25,15.7 5.25,15.7 5.25,-15.7 -5.25,-15.7
  text "1" at -6.44,4.555 h1.2
  text "1" at -6.44,4.555 h1.2
  text "1" at -6.44,4.555 h1.2
3D body: height 11.6, standoff -4, extent -5.25,-15.7 5.25,15.7